# Altium footprint library Wurth_Elektronik_Electromechanic_Wire_to_Board_Connectors_rev16a.PCBLIB: 662 footprints (part 37 of 42)
Each footprint in its own frame and in the unit in brackets; x right, y up, seen from the top. Pads: shape width x height; smd on the part's side, far side on the other; paste and mask are expansions set on the pad; w line width, h text height; cw(c..) or ccw(c..) is an arc to the next point about the centre after c.
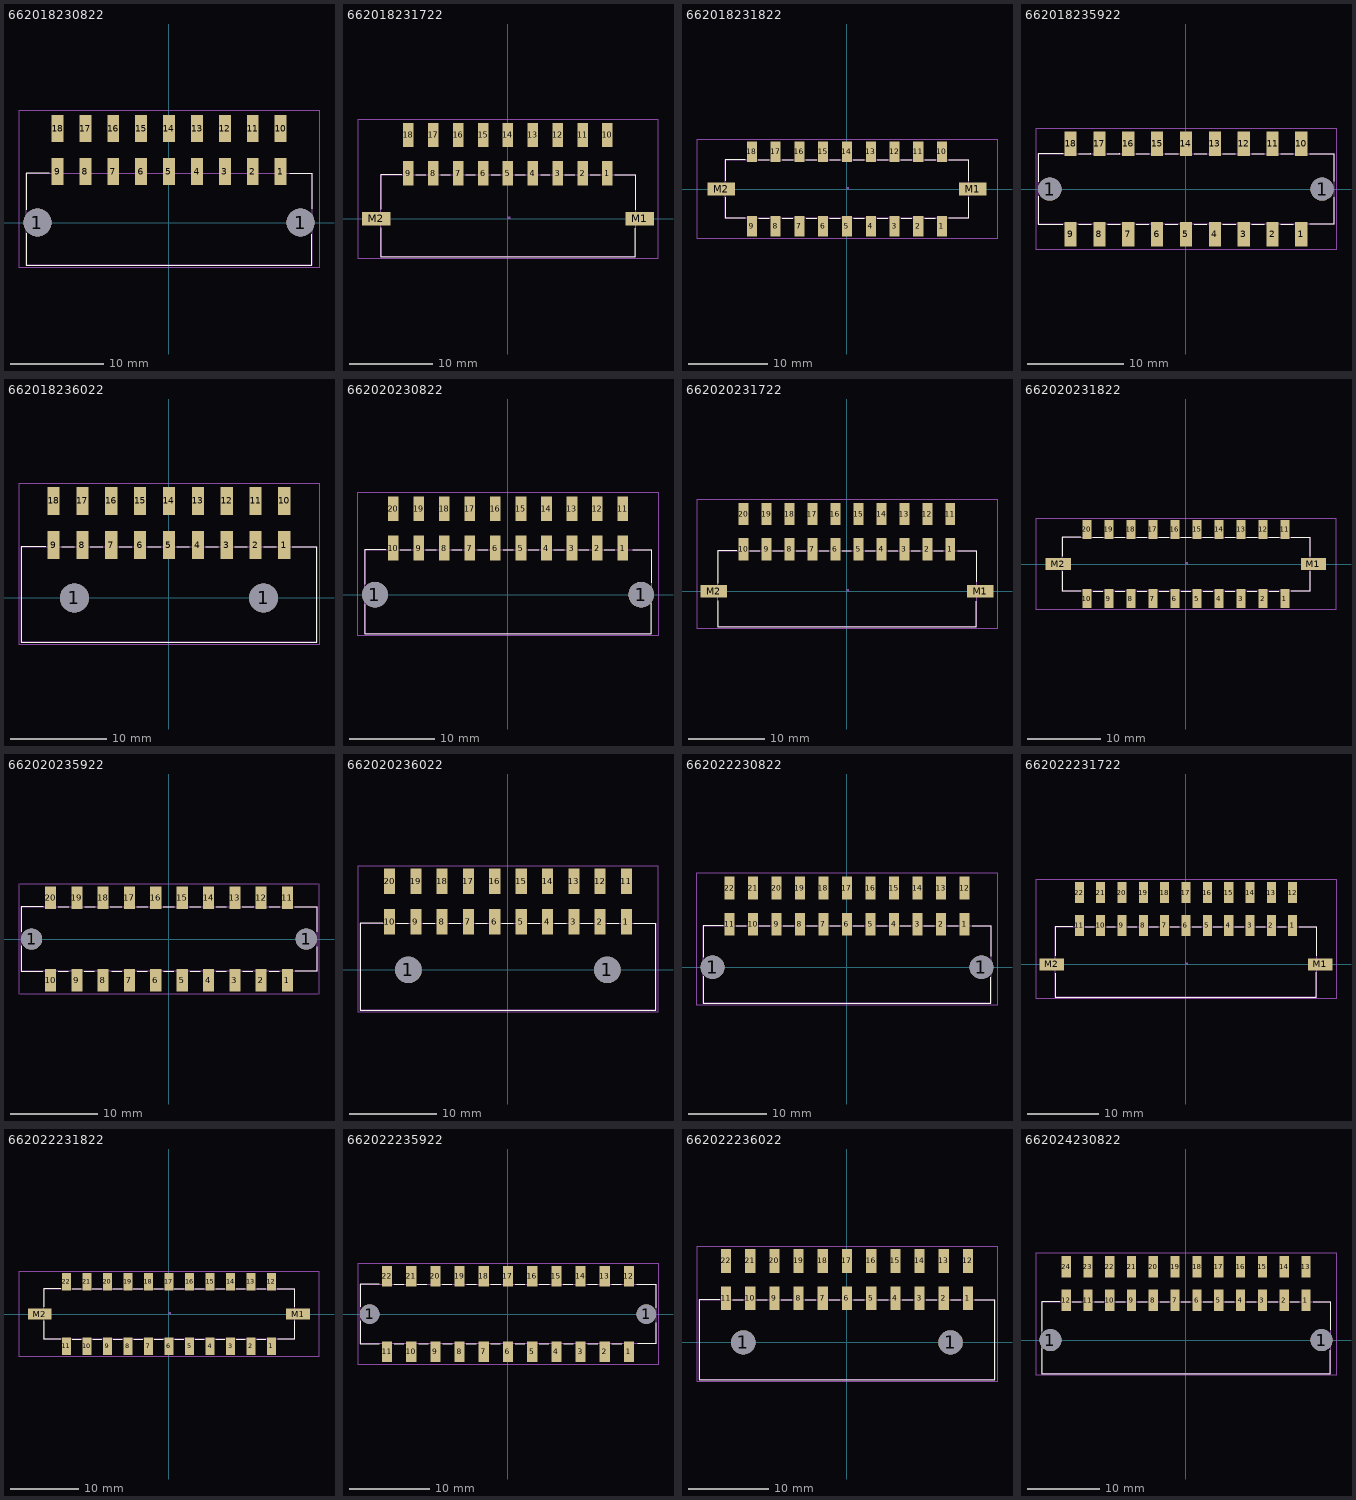
[diagram p36: the footprints below, top view; thin cyan lines are the x and y axes]

## 662018230822 [mil]
pads (20):
  round 119 hole 119: 1(-557.48,0) 1(558,0)
  rect 50x115 smd: 1(473,216) 2(355,216) 3(237,216) 4(119,216) 5(0,216) 6(-118.11,216) 7(-236.22,216) 8(-354.33,216) 9(-472.44,216) 10(473,398) 11(355,398) 12(237,398) 13(119,398) 14(0,398) 15(-118.11,398) 16(-236.22,398) 17(-354.33,398) 18(-472.44,398)
Top Overlay:
  lines w5: -604.33,-45.28 -604.33,-181.1 605,-181.1 605,-49.61 ; -604.33,54 -604.33,209 -507.87,209 ; 512,209 605,209 605,58
Mechanical 2:
  text ">NAME" at 698,82 h77.5
Mechanical 4:
  text ">VALUE" at 698,7 h77.5
Mechanical 16:
  lines w5: -604.33,-181.1 605,-181.1 605,209 -604.33,209 -604.33,-181.1
  text "1" at 448,157 h77.5
  text "18" at -502.56,332 h77.5
Mechanical 27:
  lines w5: -635.83,-190.94 636,-190.94 636,475 -635.83,475 -635.83,-190.94

## 662018231722 [mil]
pads (20):
  rect 50x115 smd: 1(473,216) 2(355,216) 3(237,216) 4(119,216) 5(0,216) 6(-118.11,216) 7(-236.22,216) 8(-354.33,216) 9(-472.44,216) 10(473,398) 11(355,398) 12(237,398) 13(119,398) 14(0,398) 15(-118.11,398) 16(-236.22,398) 17(-354.33,398) 18(-472.44,398)
  rect 136x65 smd: M1(626,0) M2(-625.79,0)
Top Overlay:
  lines w5: -604.33,-43.7 -604.33,-181.1 605,-181.1 605,-44.88 ; -604.33,45 -604.33,209 -504.72,209 ; -438.98,209 -390.55,209 -390.55,208 ; -319.69,209 -274.02,209 ; -201.18,208 -154.72,208 ; -79.13,209 -36.22,209 ; 34,209 82,209 82,208 ; 157,209 198,209 198,208 ; 271,209 318,209 ; 391,209 438,209 438,208 ; 507,209 605,209 605,43
Mechanical 2:
  text ">NAME" at 768,71 h77.5
Mechanical 4:
  text ">VALUE" at 773,-18.31 h77.5
Mechanical 10:
  region: 0,0 10,0 10,10 0,10
Mechanical 16:
  lines w5: -604.33,-181.1 605,-181.1 605,209 -604.33,209 -604.33,-181.1
  text "1" at 448,157 h77.5
  text "18" at -495.67,332 h77.5
Mechanical 27:
  lines w5: -712.2,-190.94 713,-190.94 713,473 -712.2,473 -712.2,-190.94

## 662018231822 [mil]
pads (20):
  rect 50x100 smd: 1(473,-185.04) 2(355,-185.04) 3(237,-185.04) 4(119,-185.04) 5(0,-185.04) 6(-118.11,-185.04) 7(-236.22,-185.04) 8(-354.33,-185.04) 9(-472.44,-185.04) 10(473,186) 11(355,186) 12(237,186) 13(119,186) 14(0,186) 15(-118.11,186) 16(-236.22,186) 17(-354.33,186) 18(-472.44,186)
  rect 136x65 smd: M1(626,0) M2(-625.79,0)
Top Overlay:
  lines w5: -604.33,-39.76 -604.33,-144.88 -505.12,-144.88 ; -604.33,41 -604.33,145 -505.12,145 ; -440.55,145 -386.22,145 ; -439.37,-144.88 -387.01,-144.88 ; -322.44,145 -268.11,145 ; -321.26,-144.88 -268.9,-144.88 ; -204.33,145 -150,145 ; -203.15,-144.88 -150.79,-144.88 ; -86.22,145 -31.89,145 ; -85.04,-144.88 -32.68,-144.88 ; 32,145 87,145 ; 34,-144.88 86,-144.88 ; 150,145 205,145 ; 152,-144.88 204,-144.88 ; 269,145 323,145 ; 270,-144.88 322,-144.88 ; 387,145 441,145 ; 388,-144.88 440,-144.88 ; 506,145 605,145 605,41 ; 508,-144.88 605,-144.88 605,-39.76
Mechanical 2:
  text ">NAME" at 803,38 h77.5
Mechanical 4:
  text ">VALUE" at 800,-24.41 h77.5
Mechanical 10:
  region: 0,0 10,0 10,10 0,10
  region: 0,0 10,0 10,10 0,10
  region: 0,0 10,0 10,10 0,10
  region: 0,0 10,0 10,10 0,10
  region: 0,0 10,0 10,10 0,10
  region: 0,0 10,0 10,10 0,10
  region: 0,0 10,0 10,10 0,10
  region: 0,0 10,0 10,10 0,10
  region: 0,0 10,0 10,10 0,10
  region: 0,0 10,0 10,10 0,10
  region: 0,0 10,0 10,10 0,10
  region: 0,0 10,0 10,10 0,10
  region: 0,0 10,0 10,10 0,10
  region: 0,0 10,0 10,10 0,10
  region: 0,0 10,0 10,10 0,10
  region: 0,0 10,0 10,10 0,10
  region: 0,0 10,0 10,10 0,10
Mechanical 16:
  lines w5: -604.33,-144.88 605,-144.88 605,145 -604.33,145 -604.33,-144.88
  text "1" at 460,-216.14 h77.5
  text "18" at -511.02,167 h77.5
Mechanical 27:
  lines w5: -746.06,-246.06 -746.06,247 747,247 747,-246.06 -746.06,-246.06

## 662018235922 [mil]
pads (20):
  round 95 hole 95: 1(-557.48,0) 1(558,0)
  rect 50x100 smd: 1(473,-185.04) 2(355,-185.04) 3(237,-185.04) 4(119,-185.04) 5(0,-185.04) 6(-118.11,-185.04) 7(-236.22,-185.04) 8(-354.33,-185.04) 9(-472.44,-185.04) 10(473,186) 11(355,186) 12(237,186) 13(119,186) 14(0,186) 15(-118.11,186) 16(-236.22,186) 17(-354.33,186) 18(-472.44,186)
Top Overlay:
  lines w5: -604.33,31 -604.33,145 -503.15,145 ; -603.94,-29.92 -604.33,-29.92 -604.33,-144.88 -503.94,-144.88 ; -439.76,145 -390.16,145 -390.16,146 ; -439.37,-144.88 -388.19,-144.88 ; -322.05,145 -270.87,145 -270.87,146 ; -320.47,-144.88 -269.29,-144.88 ; -203.94,145 -151.18,145 ; -202.76,-144.88 -151.57,-144.88 ; -85.04,145 -32.28,145 ; -83.86,-144.88 -32.68,-144.88 ; 34,145 85,145 ; 35,-144.88 86,-144.88 ; 151,145 202,145 ; 152,-144.88 204,-144.88 ; 269,145 321,145 ; 270,-144.88 321,-144.88 ; 388,-144.88 439,-144.88 ; 388,145 439,145 ; 508,-144.09 508,-144.88 603,-144.88 603,-144.09 605,-144.09 605,-33.86 ; 508,145 605,145 605,32 ; 605,-33.86 605,-33.86
Mechanical 2:
  text ">NAME" at 773,50 h77.5
Mechanical 4:
  text ">VALUE" at 773,-25 h77.5
Mechanical 16:
  lines w5: -604.33,-144.88 605,-144.88 605,145 -604.33,145 -604.33,-144.88
  text "1" at 448,-200 h77.5
  text "18" at -525,171 h77.5
Mechanical 27:
  lines w5: -614.17,-248.03 615,-248.03 615,249 -614.17,249 -614.17,-248.03

## 662018236022 [mil]
pads (20):
  round 119 hole 119: 1(-387.4,0) 1(388,0)
  rect 50x115 smd: 1(473,216) 2(355,216) 3(237,216) 4(119,216) 5(0,216) 6(-118.11,216) 7(-236.22,216) 8(-354.33,216) 9(-472.44,216) 10(473,398) 11(355,398) 12(237,398) 13(119,398) 14(0,398) 15(-118.11,398) 16(-236.22,398) 17(-354.33,398) 18(-472.44,398)
Top Overlay:
  lines w5: -503.94,209 -604.33,209 -604.33,-181.1 605,-181.1 605,209 506,209 ; -439.76,209 -388.19,209 ; -321.65,209 -270.08,209 ; -203.54,209 -151.97,209 ; -85.83,209 -34.25,209 ; 33,209 84,209 ; 151,209 202,209 ; 269,209 321,209 ; 388,209 439,209
Mechanical 2:
  text ">NAME" at 698,82 h77.5
Mechanical 4:
  text ">VALUE" at 698,7 h77.5
Mechanical 16:
  lines w5: -604.33,-181.1 605,-181.1 605,209 -604.33,209 -604.33,-181.1
  text "1" at 448,157 h77.5
  text "18" at -493.11,391 h77.5
Mechanical 27:
  lines w5: -614.17,-190.94 615,-190.94 615,469 -614.17,469 -614.17,-190.94

## 662020230822 [mil]
pads (22):
  round 119 hole 119: 1(-616.54,0) 1(617,0)
  rect 50x115 smd: 1(532,216) 2(414,216) 3(296,216) 4(178,216) 5(60,216) 6(-59.06,216) 7(-177.17,216) 8(-295.28,216) 9(-413.39,216) 10(-531.5,216) 11(532,398) 12(414,398) 13(296,398) 14(178,398) 15(60,398) 16(-59.06,398) 17(-177.17,398) 18(-295.28,398) 19(-413.39,398) 20(-531.5,398)
Top Overlay:
  lines w5: -663.39,-44.88 -663.39,-181.1 664,-181.1 664,-39.76 ; -663.39,49 -663.39,209 -566.54,209 ; -498.03,209 -451.18,209 ; -379.92,209 -333.07,209 ; -260.24,209 -213.39,209 ; -140.94,209 -94.09,209 ; -22.83,209 25,209 ; 95,209 142,209 ; 213,209 260,209 ; 328,209 375,209 ; 447,209 494,209 ; 577,209 664,209 664,56 ; -451.18,209 -451.18,209
Mechanical 2:
  text ">NAME" at 757,82 h77.5
Mechanical 4:
  text ">VALUE" at 757,7 h77.5
Mechanical 16:
  lines w5: -663.39,-181.1 664,-181.1 664,209 -663.39,209 -663.39,-181.1
  text "1" at 507,157 h77.5
  text "20" at -568.5,332 h77.5
Mechanical 27:
  lines w5: -694.88,-190.94 695,-190.94 695,475 -694.88,475 -694.88,-190.94

## 662020231722 [mil]
pads (22):
  rect 50x115 smd: 1(532,216) 2(414,216) 3(296,216) 4(178,216) 5(60,216) 6(-59.06,216) 7(-177.17,216) 8(-295.28,216) 9(-413.39,216) 10(-531.5,216) 11(532,398) 12(414,398) 13(296,398) 14(178,398) 15(60,398) 16(-59.06,398) 17(-177.17,398) 18(-295.28,398) 19(-413.39,398) 20(-531.5,398)
  rect 136x65 smd: M1(685,0) M2(-684.84,0)
Top Overlay:
  lines w5: -663.39,-48.03 -663.39,-181.1 664,-181.1 664,-50.39 ; -663.39,43 -663.39,209 -566.14,209 ; -498.82,210 -448.03,210 ; -381.89,210 -328.35,210 ; -261.42,210 -212.2,210 ; -142.52,210 -93.31,210 ; -24.41,210 23,210 23,209 ; 93,210 145,210 ; 213,210 262,210 ; 330,210 378,210 ; 446,210 495,210 495,209 ; 569,209 664,209 664,49
Mechanical 2:
  text ">NAME" at 827,71 h77.5
Mechanical 4:
  text ">VALUE" at 832,-18.31 h77.5
Mechanical 10:
  region: 0,0 10,0 10,10 0,10
Mechanical 16:
  lines w5: -663.39,-181.1 664,-181.1 664,209 -663.39,209 -663.39,-181.1
  text "1" at 507,157 h77.5
  text "20" at -561.61,332 h77.5
Mechanical 27:
  lines w5: -771.26,-190.94 772,-190.94 772,473 -771.26,473 -771.26,-190.94

## 662020231822 [mil]
pads (22):
  rect 50x100 smd: 1(532,-185.04) 2(414,-185.04) 3(296,-185.04) 4(178,-185.04) 5(60,-185.04) 6(-59.06,-185.04) 7(-177.17,-185.04) 8(-295.28,-185.04) 9(-413.39,-185.04) 10(-531.5,-185.04) 11(532,186) 12(414,186) 13(296,186) 14(178,186) 15(60,186) 16(-59.06,186) 17(-177.17,186) 18(-295.28,186) 19(-413.39,186) 20(-531.5,186)
  rect 136x65 smd: M1(685,0) M2(-684.84,0)
Top Overlay:
  lines w5: -663.39,-39.76 -663.39,-144.88 -564.17,-144.88 ; -663.39,41 -663.39,145 -564.17,145 ; -499.61,145 -445.28,145 ; -498.43,-144.88 -446.06,-144.88 ; -381.5,145 -327.17,145 ; -380.31,-144.88 -327.95,-144.88 ; -263.39,145 -209.06,145 ; -262.2,-144.88 -209.84,-144.88 ; -145.28,145 -90.94,145 ; -144.09,-144.88 -91.73,-144.88 ; -27.17,145 28,145 ; -25.98,-144.88 27,-144.88 ; 91,145 146,145 ; 93,-144.88 145,-144.88 ; 210,145 264,145 ; 211,-144.88 263,-144.88 ; 328,145 382,145 ; 329,-144.88 381,-144.88 ; 446,145 500,145 ; 447,-144.88 499,-144.88 ; 565,145 664,145 664,41 ; 567,-144.88 664,-144.88 664,-39.76
Mechanical 2:
  text ">NAME" at 921,38 h77.5
Mechanical 4:
  text ">VALUE" at 919,-24.41 h77.5
Mechanical 10:
  region: 0,0 10,0 10,10 0,10
  region: 0,0 10,0 10,10 0,10
  region: 0,0 10,0 10,10 0,10
  region: 0,0 10,0 10,10 0,10
  region: 0,0 10,0 10,10 0,10
  region: 0,0 10,0 10,10 0,10
  region: 0,0 10,0 10,10 0,10
  region: 0,0 10,0 10,10 0,10
  region: 0,0 10,0 10,10 0,10
  region: 0,0 10,0 10,10 0,10
  region: 0,0 10,0 10,10 0,10
  region: 0,0 10,0 10,10 0,10
  region: 0,0 10,0 10,10 0,10
  region: 0,0 10,0 10,10 0,10
  region: 0,0 10,0 10,10 0,10
  region: 0,0 10,0 10,10 0,10
  region: 0,0 10,0 10,10 0,10
  region: 0,0 10,0 10,10 0,10
  region: 0,0 10,0 10,10 0,10
Mechanical 16:
  lines w5: -663.39,-144.88 664,-144.88 664,145 -663.39,145 -663.39,-144.88
  text "1" at 519,-216.14 h77.5
  text "20" at -576.97,167 h77.5
Mechanical 27:
  lines w5: -805.12,-246.06 -805.12,247 806,247 806,-246.06 -805.12,-246.06

## 662020235922 [mil]
pads (22):
  round 95 hole 95: 1(-616.54,0) 1(617,0)
  rect 50x100 smd: 1(532,-185.04) 2(414,-185.04) 3(296,-185.04) 4(178,-185.04) 5(60,-185.04) 6(-59.06,-185.04) 7(-177.17,-185.04) 8(-295.28,-185.04) 9(-413.39,-185.04) 10(-531.5,-185.04) 11(532,186) 12(414,186) 13(296,186) 14(178,186) 15(60,186) 16(-59.06,186) 17(-177.17,186) 18(-295.28,186) 19(-413.39,186) 20(-531.5,186)
Top Overlay:
  lines w5: -663.39,34 -663.39,145 -563.78,145 ; -662.99,-29.13 -663.39,-29.13 -663.39,-144.88 -566.14,-144.88 ; -496.85,145 -450,145 ; -496.06,-144.88 -451.18,-144.88 ; -379.13,-144.88 -334.25,-144.88 ; -378.35,145 -330.31,145 ; -262.6,145 -211.02,145 ; -257.09,-144.88 -212.2,-144.88 ; -143.7,145 -95.28,145 ; -141.34,-144.88 -96.46,-144.88 ; -25.59,145 25,145 ; -23.62,-144.88 22,-144.88 ; 94,145 142,145 ; 95,-144.88 140,-144.88 ; 213,-145.28 258,-145.28 ; 213,145 258,145 ; 330,145 380,145 ; 331,-145.28 376,-145.28 ; 450,145 497,145 ; 451,-145.28 496,-145.28 ; 565,145 664,145 664,32 ; 568,-144.88 664,-144.88 664,-35.43 ; -450,145 -450,145 ; 380,145 380,145
Mechanical 2:
  text ">NAME" at 832,50 h77.5
Mechanical 4:
  text ">VALUE" at 832,-25 h77.5
Mechanical 16:
  lines w5: -663.39,-144.88 664,-144.88 664,145 -663.39,145 -663.39,-144.88
  text "1" at 507,-200 h77.5
  text "20" at -569.49,173 h77.5
Mechanical 27:
  lines w5: -673.23,-248.03 -673.23,249 ; -667.32,-248.03 668,-248.03 ; -667.32,249 668,249 ; 674,-248.03 674,249

## 662020236022 [mil]
pads (22):
  round 119 hole 119: 1(-446.46,0) 1(447,0)
  rect 50x115 smd: 1(532,216) 2(414,216) 3(296,216) 4(178,216) 5(60,216) 6(-59.06,216) 7(-177.17,216) 8(-295.28,216) 9(-413.39,216) 10(-531.5,216) 11(532,398) 12(414,398) 13(296,398) 14(178,398) 15(60,398) 16(-59.06,398) 17(-177.17,398) 18(-295.28,398) 19(-413.39,398) 20(-531.5,398)
Top Overlay:
  lines w5: -562.99,209 -663.39,209 -663.39,-181.1 664,-181.1 664,209 565,209 ; -498.82,209 -447.24,209 ; -380.71,209 -329.13,209 ; -262.6,209 -211.02,209 ; -144.88,209 -93.31,209 ; -26.77,209 25,209 ; 92,209 143,209 ; 210,209 262,209 ; 328,209 380,209 ; 446,209 498,209
Mechanical 2:
  text ">NAME" at 757,82 h77.5
Mechanical 4:
  text ">VALUE" at 757,7 h77.5
Mechanical 16:
  lines w5: -663.39,-181.1 664,-181.1 664,209 -663.39,209 -663.39,-181.1
  text "1" at 507,157 h77.5
  text "20" at -552.17,391 h77.5
Mechanical 27:
  lines w5: -673.23,-190.94 674,-190.94 674,469 -673.23,469 -673.23,-190.94

## 662022230822 [mil]
pads (24):
  round 119 hole 119: 1(-675.59,0) 1(676,0)
  rect 50x115 smd: 1(591,216) 2(473,216) 3(355,216) 4(237,216) 5(119,216) 6(0,216) 7(-118.11,216) 8(-236.22,216) 9(-354.33,216) 10(-472.44,216) 11(-590.55,216) 12(591,398) 13(473,398) 14(355,398) 15(237,398) 16(119,398) 17(0,398) 18(-118.11,398) 19(-236.22,398) 20(-354.33,398) 21(-472.44,398) 22(-590.55,398)
Top Overlay:
  lines w5: -722.44,-46.06 -722.44,-181.5 723,-181.5 723,-49.61 ; -722.44,50 -722.44,209 -621.26,209 ; -557.87,209 -505.51,209 ; -441.73,209 -389.37,209 ; -320.87,209 -268.5,209 ; -201.97,209 -149.61,209 ; -85.43,209 -33.07,209 ; 31,209 83,209 ; 150,209 203,209 ; 268,209 321,209 ; 387,209 439,209 ; 506,209 559,209 ; 630,209 723,209 723,56
Mechanical 2:
  text ">NAME" at 816,82 h77.5
Mechanical 4:
  text ">VALUE" at 816,7 h77.5
Mechanical 16:
  lines w5: -722.44,-181.1 723,-181.1 723,209 -722.44,209 -722.44,-181.1
  text "1" at 566,157 h77.5
  text "22" at -634.45,332 h77.5
Mechanical 27:
  lines w5: -753.94,-190.94 754,-190.94 754,475 -753.94,475 -753.94,-190.94

## 662022231722 [mil]
pads (24):
  rect 50x115 smd: 1(591,216) 2(473,216) 3(355,216) 4(237,216) 5(119,216) 6(0,216) 7(-118.11,216) 8(-236.22,216) 9(-354.33,216) 10(-472.44,216) 11(-590.55,216) 12(591,398) 13(473,398) 14(355,398) 15(237,398) 16(119,398) 17(0,398) 18(-118.11,398) 19(-236.22,398) 20(-354.33,398) 21(-472.44,398) 22(-590.55,398)
  rect 136x65 smd: M1(744,0) M2(-743.9,0)
Top Overlay:
  lines w5: -722.44,-48.43 -722.44,-180.71 723,-180.71 723,-44.09 ; -722.44,47 -722.44,209 -625.98,209 ; -557.87,209 -507.48,209 ; -439.37,209 -390.16,209 ; -322.44,209 -271.65,209 ; -201.97,209 -153.15,209 ; -85.83,209 -37.01,209 -37.01,210 ; 35,209 84,209 84,210 ; 152,209 201,209 201,210 ; 269,209 320,209 ; 388,209 439,209 ; 508,209 555,209 ; 627,209 723,209 723,47
Mechanical 2:
  text ">NAME" at 886,71 h77.5
Mechanical 4:
  text ">VALUE" at 891,-18.31 h77.5
Mechanical 10:
  region: 0,0 10,0 10,10 0,10
Mechanical 16:
  lines w5: -722.44,-181.1 723,-181.1 723,209 -722.44,209 -722.44,-181.1
  text "1" at 566,157 h77.5
  text "22" at -627.56,332 h77.5
Mechanical 27:
  lines w5: -830.32,-190.94 831,-190.94 831,473 -830.32,473 -830.32,-190.94

## 662022231822 [mil]
pads (24):
  rect 50x100 smd: 1(591,-185.04) 2(473,-185.04) 3(355,-185.04) 4(237,-185.04) 5(119,-185.04) 6(0,-185.04) 7(-118.11,-185.04) 8(-236.22,-185.04) 9(-354.33,-185.04) 10(-472.44,-185.04) 11(-590.55,-185.04) 12(591,186) 13(473,186) 14(355,186) 15(237,186) 16(119,186) 17(0,186) 18(-118.11,186) 19(-236.22,186) 20(-354.33,186) 21(-472.44,186) 22(-590.55,186)
  rect 136x65 smd: M1(744,0) M2(-743.9,0)
Top Overlay:
  lines w5: -722.44,-39.76 -722.44,-144.88 -623.23,-144.88 ; -722.44,41 -722.44,145 -623.23,145 ; -558.66,145 -504.33,145 ; -557.48,-144.88 -505.12,-144.88 ; -440.55,145 -386.22,145 ; -439.37,-144.88 -387.01,-144.88 ; -322.44,145 -268.11,145 ; -321.26,-144.88 -268.9,-144.88 ; -204.33,145 -150,145 ; -203.15,-144.88 -150.79,-144.88 ; -86.22,145 -31.89,145 ; -85.04,-144.88 -32.68,-144.88 ; 32,145 87,145 ; 34,-144.88 86,-144.88 ; 150,145 205,145 ; 152,-144.88 204,-144.88 ; 269,145 323,145 ; 270,-144.88 322,-144.88 ; 387,145 441,145 ; 388,-144.88 440,-144.88 ; 505,145 559,145 ; 506,-144.88 558,-144.88 ; 624,145 723,145 723,41 ; 626,-144.88 723,-144.88 723,-39.76
Mechanical 2:
  text ">NAME" at 980,38 h77.5
Mechanical 4:
  text ">VALUE" at 978,-24.41 h77.5
Mechanical 10:
  region: 0,0 10,0 10,10 0,10
  region: 0,0 10,0 10,10 0,10
  region: 0,0 10,0 10,10 0,10
  region: 0,0 10,0 10,10 0,10
  region: 0,0 10,0 10,10 0,10
  region: 0,0 10,0 10,10 0,10
  region: 0,0 10,0 10,10 0,10
  region: 0,0 10,0 10,10 0,10
  region: 0,0 10,0 10,10 0,10
  region: 0,0 10,0 10,10 0,10
  region: 0,0 10,0 10,10 0,10
  region: 0,0 10,0 10,10 0,10
  region: 0,0 10,0 10,10 0,10
  region: 0,0 10,0 10,10 0,10
  region: 0,0 10,0 10,10 0,10
  region: 0,0 10,0 10,10 0,10
  region: 0,0 10,0 10,10 0,10
  region: 0,0 10,0 10,10 0,10
  region: 0,0 10,0 10,10 0,10
  region: 0,0 10,0 10,10 0,10
  region: 0,0 10,0 10,10 0,10
Mechanical 16:
  lines w5: -722.44,-144.88 723,-144.88 723,145 -722.44,145 -722.44,-144.88
  text "1" at 578,-216.14 h77.5
  text "22" at -617.91,167 h77.5
Mechanical 27:
  lines w5: -864.17,-246.06 -864.17,247 865,247 865,-246.06 -864.17,-246.06

## 662022235922 [mil]
pads (24):
  round 95 hole 95: 1(-675.59,0) 1(676,0)
  rect 50x100 smd: 1(591,-185.04) 2(473,-185.04) 3(355,-185.04) 4(237,-185.04) 5(119,-185.04) 6(0,-185.04) 7(-118.11,-185.04) 8(-236.22,-185.04) 9(-354.33,-185.04) 10(-472.44,-185.04) 11(-590.55,-185.04) 12(591,186) 13(473,186) 14(355,186) 15(237,186) 16(119,186) 17(0,186) 18(-118.11,186) 19(-236.22,186) 20(-354.33,186) 21(-472.44,186) 22(-590.55,186)
Top Overlay:
  lines w5: -722.44,-33.46 -722.44,-144.88 -627.95,-144.88 ; -722.44,37 -722.44,145 -628.35,145 ; -555.12,-144.88 -508.66,-144.88 ; -555.12,145 -508.66,145 ; -441.73,145 -395.28,145 ; -436.22,-144.88 -389.76,-144.88 ; -319.69,145 -273.23,145 ; -318.9,-144.88 -272.44,-144.88 ; -202.36,-144.88 -155.91,-144.88 ; -201.18,145 -154.72,145 ; -83.07,-144.88 -36.61,-144.88 ; -82.68,145 -36.22,145 ; 35,-144.88 81,-144.88 ; 36,145 82,145 ; 154,-144.88 200,-144.88 ; 154,145 201,145 ; 271,145 317,145 ; 272,-144.88 319,-144.88 ; 389,145 436,145 ; 391,-144.88 438,-144.88 ; 507,145 554,145 ; 508,-144.88 555,-144.88 ; 630,145 723,145 723,32 ; 634,-144.88 723,-144.88 723,-43.31
Mechanical 2:
  text ">NAME" at 891,50 h77.5
Mechanical 4:
  text ">VALUE" at 891,-25 h77.5
Mechanical 16:
  lines w5: -722.44,-144.88 723,-144.88 723,145 -722.44,145 -722.44,-144.88
  text "1" at 566,-200 h77.5
  text "22" at -625,146 h77.5
Mechanical 27:
  lines w5: -732.28,-248.03 733,-248.03 733,249 -732.28,249 -732.28,-248.03

## 662022236022 [mil]
pads (24):
  round 119 hole 119: 1(-505.51,0) 1(506,0)
  rect 50x115 smd: 1(591,216) 2(473,216) 3(355,216) 4(237,216) 5(119,216) 6(0,216) 7(-118.11,216) 8(-236.22,216) 9(-354.33,216) 10(-472.44,216) 11(-590.55,216) 12(591,398) 13(473,398) 14(355,398) 15(237,398) 16(119,398) 17(0,398) 18(-118.11,398) 19(-236.22,398) 20(-354.33,398) 21(-472.44,398) 22(-590.55,398)
Top Overlay:
  lines w5: -622.05,209 -722.44,209 -722.44,-181.1 723,-181.1 723,209 624,209 ; -557.87,209 -506.3,209 ; -439.76,209 -388.19,209 ; -321.65,209 -270.08,209 ; -203.94,209 -152.36,209 ; -85.83,209 -34.25,209 ; 33,209 84,209 ; 151,209 202,209 ; 269,209 321,209 ; 387,209 439,209 ; 506,209 557,209
Mechanical 2:
  text ">NAME" at 816,82 h77.5
Mechanical 4:
  text ">VALUE" at 816,7 h77.5
Mechanical 16:
  lines w5: -722.44,-181.1 723,-181.1 723,209 -722.44,209 -722.44,-181.1
  text "1" at 566,157 h77.5
  text "22" at -611.22,391 h77.5
Mechanical 27:
  lines w5: -732.28,-190.94 733,-190.94 733,469 -732.28,469 -732.28,-190.94

## 662024230822 [mil]
pads (26):
  round 119 hole 119: 1(-734.65,0) 1(735,0)
  rect 50x115 smd: 1(650,216) 2(532,216) 3(414,216) 4(296,216) 5(178,216) 6(60,216) 7(-59.06,216) 8(-177.17,216) 9(-295.28,216) 10(-413.39,216) 11(-531.5,216) 12(-649.61,216) 13(650,398) 14(532,398) 15(414,398) 16(296,398) 17(178,398) 18(60,398) 19(-59.06,398) 20(-177.17,398) 21(-295.28,398) 22(-413.39,398) 23(-531.5,398) 24(-649.61,398)
Top Overlay:
  lines w5: -781.5,-43.7 -781.5,-181.1 782,-181.1 782,-54.33 ; -781.5,49 -781.5,209 -683.07,209 ; -617.32,209 -566.93,209 ; -494.88,209 -444.49,209 ; -379.92,209 -329.53,209 ; -261.02,209 -210.63,209 ; -140.16,209 -89.76,209 ; -26.77,209 24,209 ; 93,209 143,209 ; 210,209 261,209 ; 330,209 380,209 ; 446,209 497,209 ; 565,209 615,209 ; 690,209 782,209 782,56
Mechanical 2:
  text ">NAME" at 875,82 h77.5
Mechanical 4:
  text ">VALUE" at 875,7 h77.5
Mechanical 16:
  lines w5: -781.5,-181.1 782,-181.1 782,209 -781.5,209 -781.5,-181.1
  text "1" at 625,157 h77.5
  text "24" at -675.39,332 h77.5
Mechanical 27:
  lines w5: -812.99,-190.94 813,-190.94 813,475 -812.99,475 -812.99,-190.94